# Altium footprint library Special.PcbLib: 38 footprints (part 2 of 3)
Each footprint in its own frame and in the unit in brackets; x right, y up, seen from the top. Pads: shape width x height; smd on the part's side, far side on the other; paste and mask are expansions set on the pad; w line width, h text height; cw(c..) or ccw(c..) is an arc to the next point about the centre after c.
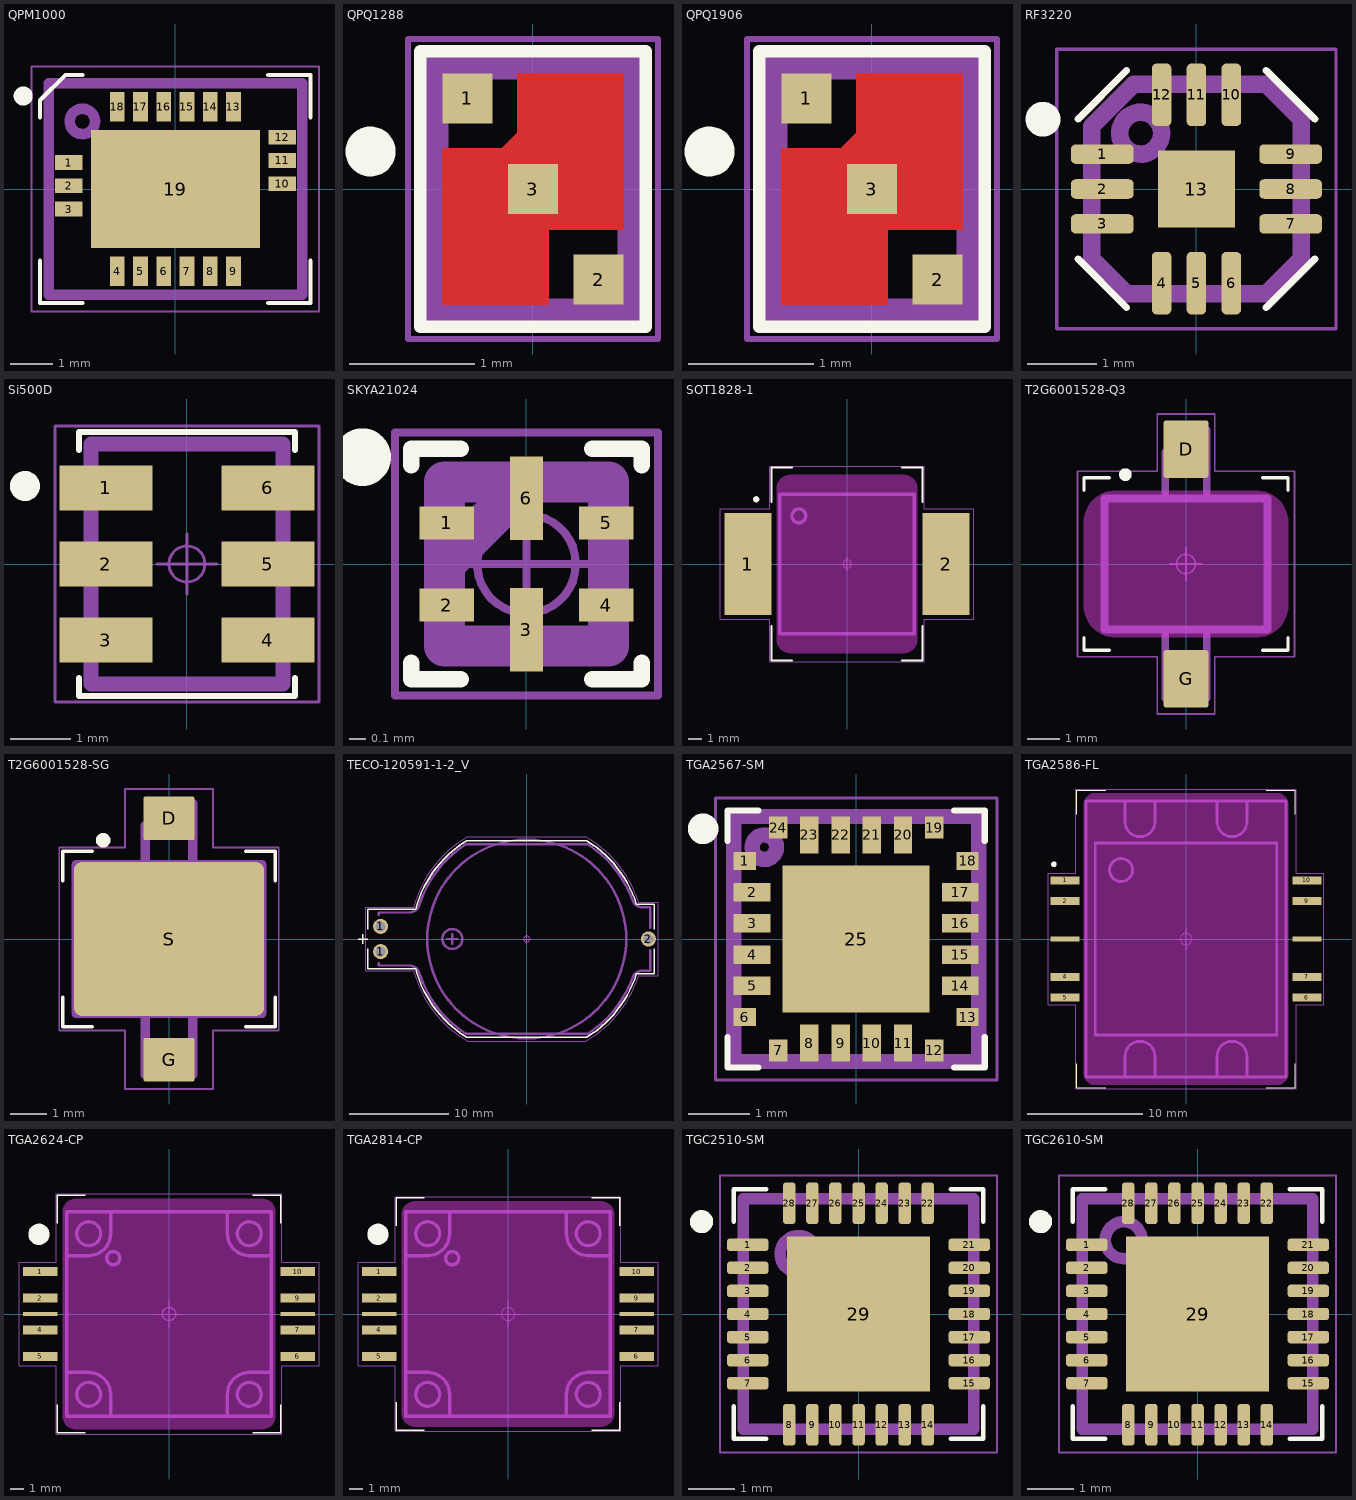
[diagram p1: the footprints below, top view; thin cyan lines are the x and y axes]

## QPM1000 [mm]
height 1.8
pads (19):
  rect 0.65x0.35 smd: 1(-2.525,0.625) 2(-2.525,0.075) 3(-2.525,-0.475) 10(2.525,0.125) 11(2.525,0.675) 12(2.525,1.225)
  rect 0.35x0.7 smd: 4(-1.375,-1.95) 5(-0.825,-1.95) 6(-0.275,-1.95) 7(0.275,-1.95) 8(0.825,-1.95) 9(1.375,-1.95) 13(1.375,1.95) 14(0.825,1.95) 15(0.275,1.95) 16(-0.275,1.95) 17(-0.825,1.95) 18(-1.375,1.95)
  rect 4x2.8 smd: 19(0,0)
Top Overlay:
  circle w0.25: c-3.6,2.2 r0.1
  lines w0.1: -3.2,-1.7 -3.2,-2.7 -2.2,-2.7 ; -3.2,1.7 -3.2,2.1 -2.6,2.7 -2.2,2.7 ; 2.2,-2.7 3.2,-2.7 3.2,-1.7 ; 2.2,2.7 3.2,2.7 3.2,1.7
Top Assembly:
  circle w0.25: c-2.2,1.6 r0.3
  lines w0.25: -3,-2.5 3,-2.5 3,2.5 -3,2.5 -3,-2.5
  text ".Designator" at -2.3,-0.4 h1.5
Top Courtyard:
  circle w0.05: c0,0 r0.3
  lines w0.05: -0.5,0 0.5,0 ; 0,-0.5 0,0.5 ; -3.4,-2.9 -3.4,2.9 3.4,2.9 3.4,-2.9 -3.4,-2.9
3D body "QPM1000.STEP": height 1.77, standoff 0, extent -3,-2.5 3,2.5

## QPQ1288 [mm] "Qorvo QPQ1288"
height 0.81
pads (3):
  rect 0.4x0.4 smd: 1(-0.525,0.725) 2(0.525,-0.725) 3(0,0)
Top Layer:
  region: 0.725,0.925 -0.125,0.925 -0.125,0.45 -0.25,0.325 -0.725,0.325 -0.725,-0.925 0.125,-0.925 0.125,-0.325 0.725,-0.325
Top Overlay:
  circle w0.2: c-1.3,0.3 r0.1
  lines w0.1: -0.9,-1.1 0.9,-1.1 0.9,1.1 -0.9,1.1 -0.9,-1.1
Top Assembly:
  lines w0.25: -0.8,-1 -0.8,1 0.8,1 0.8,-1 -0.8,-1
  text ".Designator" at -2,1.6 h1.5
Top Courtyard:
  circle w0.05: c0,0 r0.3
  lines w0.05: -0.5,0 0.5,0 ; 0,-0.5 0,0.5 ; -1,-1.2 1,-1.2 1,1.2 -1,1.2 -1,-1.2
3D body "QPQ1288.STEP": height 0.81, standoff 0, extent -0.8,-1 0.8,1

## QPQ1906 [mm] "Qorvo QPQ1906"
height 0.915
pads (3):
  rect 0.4x0.4 smd: 1(-0.525,0.725) 2(0.525,-0.725) 3(0,0)
Top Layer:
  region: 0.725,0.925 -0.125,0.925 -0.125,0.45 -0.25,0.325 -0.725,0.325 -0.725,-0.925 0.125,-0.925 0.125,-0.325 0.725,-0.325
Top Overlay:
  circle w0.2: c-1.3,0.3 r0.1
  lines w0.1: -0.9,-1.1 -0.9,1.1 0.9,1.1 0.9,-1.1 -0.9,-1.1
Top Assembly:
  lines w0.25: -0.8,-1 0.8,-1 0.8,1 -0.8,1 -0.8,-1
  text ".Designator" at -2,1.6 h1.5
Top Courtyard:
  circle w0.05: c0,0 r0.3
  lines w0.05: -0.5,0 0.5,0 ; 0,-0.5 0,0.5 ; -1,-1.2 -1,1.2 1,1.2 1,-1.2 -1,-1.2
3D body "QPQ1906.STEP": height 0.91, standoff 0, extent -0.8,-1 0.8,1

## RF3220 [mm] "RFMD RF3220"
height 0.9
pads (13):
  rrect50% 0.9x0.28 smd: 1(-1.35,0.5) 2(-1.35,0) 3(-1.35,-0.5) 7(1.35,-0.5) 8(1.35,0) 9(1.35,0.5)
  rrect50% 0.28x0.9 smd: 4(-0.5,-1.35) 5(0,-1.35) 6(0.5,-1.35) 10(0.5,1.35) 11(0,1.35) 12(-0.5,1.35)
  rect 1.1x1.1 smd: 13(0,0)
Top Overlay:
  circle w0.3: c-2.2,1 r0.1
  lines w0.1: -1.7,-1 -1,-1.7 ; -1.7,1 -1,1.7 ; 1,-1.7 1.7,-1 ; 1,1.7 1.7,1
Top Assembly:
  circle w0.25: c-0.8,0.8 r0.3
  lines w0.25: -1.5,-1 -1,-1.5 1,-1.5 1.5,-1 1.5,1 1,1.5 -0.9,1.5 -1.5,0.9 -1.5,-1
  text ".Designator" at -1.3,-0.6 h1.5
Top Courtyard:
  circle w0.05: c0,0 r0.3
  lines w0.05: -0.5,0 0.5,0 ; 0,-0.5 0,0.5 ; -2,-2 -2,2 2,2 2,-2 -2,-2
3D body "RF3220.STEP": height 0.9, standoff 0, extent -1.55,-1.55 1.55,1.55

## Si500D [mm] "Si500D 3.2 x 5.0 mm XOs"
height 0.9
pads (6):
  rect 1.55x0.75 smd: 1(-1.35,1.27) 2(-1.35,0) 3(-1.35,-1.27) 4(1.35,-1.27) 5(1.35,0) 6(1.35,1.27)
Top Overlay:
  circle w0.3: c-2.7,1.3 r0.1
  lines w0.1: -1.8,-1.9 -1.8,-2.2 1.8,-2.2 1.8,-1.9 ; -1.8,1.9 -1.8,2.2 1.8,2.2 1.8,1.9
Top Assembly:
  circle w0.25: c-1,1.3 r0.2
  lines w0.25: -1.6,-2 -1.6,2 1.6,2 1.6,-2 -1.6,-2
  text ".Designator" at 1.1,-1.7 h1.5
Top Courtyard:
  circle w0.05: c0,0 r0.3
  lines w0.05: -0.5,0 0.5,0 ; 0,-0.5 0,0.5 ; -2.2,-2.3 2.2,-2.3 2.2,2.3 -2.2,2.3 -2.2,-2.3
3D body "Si500D.STEP": height 0.9, standoff 0, extent -1.6,-2 1.6,2

## SKYA21024 [mm] "Slyworks SKYA21024"
height 0.5
pads (6):
  rect 0.33x0.2 smd: 1(-0.485,0.25) 2(-0.485,-0.25) 4(0.485,-0.25) 5(0.485,0.25)
  rect 0.2x0.51 smd: 3(0,-0.4) 6(0,0.4)
Top Overlay:
  circle w0.3: c-1,0.65 r0.025
  lines w0.1: -0.7,-0.6 -0.7,-0.7 -0.4,-0.7 ; -0.7,0.6 -0.7,0.7 -0.4,0.7 ; 0.4,-0.7 0.7,-0.7 0.7,-0.6 ; 0.4,0.7 0.7,0.7 0.7,0.6
Top Assembly:
  lines w0.25: -0.5,0 0,0.5 ; -0.5,-0.5 0.5,-0.5 0.5,0.5 -0.5,0.5 -0.5,-0.5
  text ".Designator" at -1.7,1 h1.5
Top Courtyard:
  circle w0.05: c0,0 r0.3
  lines w0.05: -0.5,0 0.5,0 ; 0,-0.5 0,0.5 ; -0.8,-0.8 -0.8,0.8 0.8,0.8 0.8,-0.8 -0.8,-0.8
3D body "SKYA21024.STEP": height 0.5, standoff 0, extent -0.55,-0.55 0.55,0.55

## SOT1828-1 [mm] "NXP CASE SOT1828-1"
height 2.5
pads (2):
  rect 3.4x7.4 smd: 1(-7.2,0) 2(7.2,0)
Top Overlay:
  circle w0.25: c-6.6,4.7 r0.1
  lines w0.15: -5.5,-4.5 -5.5,-7 -4,-7 ; -5.5,4.5 -5.5,7 -4,7 ; 4,-7 5.5,-7 5.5,-4.5 ; 4,7 5.5,7 5.5,4.5
Keep-Out Layer:
  board cut-out: -5.1,-5.5 -5.1,5.5 -5.1,5.598 -5.062,5.792 -4.986,5.974 -4.877,6.137 -4.737,6.277 -4.574,6.386 -4.392,6.462 -4.198,6.5 -4.1,6.5 4.1,6.5 4.198,6.5 4.392,6.462 4.574,6.386 4.737,6.277 4.877,6.137 4.986,5.974 5.062,5.792 5.1,5.598 5.1,5.5 5.1,-5.5 5.1,-5.598 5.062,-5.792 4.986,-5.974 4.877,-6.137 4.737,-6.277 4.574,-6.386 4.392,-6.462 4.198,-6.5 4.1,-6.5 -4.1,-6.5 -4.198,-6.5 -4.392,-6.462 -4.574,-6.386 -4.737,-6.277 -4.877,-6.137 -4.986,-5.974 -5.062,-5.792 -5.1,-5.598
Top Assembly:
  circle w0.25: c-3.5,3.5 r0.5
  lines w0.25: -4.9,-5.075 4.9,-5.075 4.9,5.075 -4.9,5.075 -4.9,-5.075
  text ".Designator" at -3.4,-0.3 h1.5
Top Courtyard:
  circle w0.05: c0,0 r0.3
  lines w0.05: -0.5,0 0.5,0 ; 0,-0.5 0,0.5 ; -9.2,-4 -9.2,4 -5.6,4 -5.6,7.1 5.6,7.1 5.6,4 9.2,4 9.2,-4 5.6,-4 5.6,-7.1 -5.6,-7.1 -5.6,-4 -9.2,-4
3D body "CASE SOT1828-1.STEP": height 2.57, standoff -1.58, extent -7.8,-5.08 7.8,5.08

## T2G6001528-Q3 [mm] "Qorvo T2G6001528-Q3"
height 1.7
pads (2):
  rrect10% 1.4x1.8 smd: D(0,3.6) G(0,-3.6)
Top Overlay:
  circle w0.2: c-1.9,2.8 r0.1
  lines w0.1: -3.2,-2.3 -3.2,-2.7 -2.4,-2.7 ; -3.2,2.3 -3.2,2.7 -2.4,2.7 ; 2.4,-2.7 3.2,-2.7 3.2,-2.3 ; 2.4,2.7 3.2,2.7 3.2,2.3
Keep-Out Layer:
  board cut-out: -3.2,-1.3 -3.2,1.3 -3.2,1.399 -3.162,1.592 -3.086,1.774 -2.977,1.937 -2.837,2.077 -2.674,2.186 -2.492,2.262 -2.298,2.3 -2.2,2.3 2.2,2.3 2.298,2.3 2.492,2.261 2.674,2.186 2.837,2.077 2.977,1.937 3.086,1.774 3.162,1.592 3.2,1.398 3.2,1.3 3.2,-1.3 3.2,-1.399 3.162,-1.592 3.086,-1.774 2.977,-1.938 2.837,-2.077 2.674,-2.186 2.492,-2.262 2.298,-2.3 2.2,-2.3 -2.2,-2.3 -2.298,-2.3 -2.492,-2.262 -2.674,-2.186 -2.837,-2.077 -2.977,-1.937 -3.086,-1.774 -3.162,-1.592 -3.2,-1.399
Top Assembly:
  lines w0.25: -0.65,-2.05 -0.65,-4.2 0.65,-4.2 0.65,-2.05 ; -0.65,2.05 -0.65,3.5 0.05,4.2 0.65,4.2 0.65,2.05 ; -2.55,-2.05 2.55,-2.05 2.55,2.05 -2.55,2.05 -2.55,-2.05
  text ".Designator" at -2.2,-0.3 h1.5
Top Courtyard:
  circle w0.05: c0,0 r0.3
  lines w0.05: -0.5,0 0.5,0 ; 0,-0.5 0,0.5 ; -3.4,-2.9 -0.9,-2.9 -0.9,-4.7 0.9,-4.7 0.9,-2.9 3.4,-2.9 3.4,2.9 0.9,2.9 0.9,4.7 -0.9,4.7 -0.9,2.9 -3.4,2.9 -3.4,-2.9
3D body "T2G6001528-Q3.STEP": height 2.08, standoff -0.71, extent -2.54,-4.203 2.54,4.204

## T2G6001528-SG [mm] "Qorvo T2G6001528-SG"
height 2.8
pads (3):
  rrect10% 1.4x1.2 smd: D(0,3.3) G(0,-3.3)
  rrect10% 5.2x4.2 smd: S(0,0)
Top Overlay:
  circle w0.2: c-1.8,2.7 r0.1
  lines w0.1: -2.9,-1.6 -2.9,-2.4 -2.1,-2.4 ; -2.9,1.6 -2.9,2.4 -2.1,2.4 ; 2.1,-2.4 2.9,-2.4 2.9,-1.6 ; 2.1,2.4 2.9,2.4 2.9,1.6
Top Assembly:
  lines w0.25: -0.65,-2.05 -0.65,-3.7 0.65,-3.7 0.65,-2.05 ; -0.65,2.05 -0.65,3.1 -0.05,3.7 0.65,3.7 0.65,2.05 ; -2.54,-2.03 -2.54,2.03 2.54,2.03 2.54,-2.03 -2.54,-2.03
  text ".Designator" at -2.2,-0.4 h1.5
Top Courtyard:
  circle w0.05: c0,0 r0.3
  lines w0.05: -0.5,0 0.5,0 ; 0,-0.5 0,0.5 ; -3,-2.5 -3,2.5 -1.2,2.5 -1.2,4.1 1.2,4.1 1.2,2.5 3,2.5 3,-2.5 1.2,-2.5 1.2,-4.1 -1.2,-4.1 -1.2,-2.5 -3,-2.5
3D body "T2G6001528-SG.STEP": height 2.79, standoff 0, extent -2.54,-3.683 2.54,3.683

## TECO-120591-1-2_V [mm] "Lithium Battery Holder"
height 6.5
pads (3):
  round 1.52 hole 1.02: 1(-14.69,-1.27) 1(-14.69,1.27) 2(12.23,0)
Top Overlay:
  lines w0.15: -16.97,0 -15.97,0 ; -16.47,-0.5 -16.47,0.5 ; -16,-1 -16,-2.997 -11.183,-2.997 ccw(c0,0) -6.045,-9.874 6.045,-9.874 ccw(c0,0) 11.036,-3.5 12.8,-3.5 12.8,-1 ; -16,1 -16,2.997 -11.183,2.997 cw(c0,0) -6.045,9.874 6.045,9.874 cw(c0,0) 11.036,3.5 12.8,3.5 12.8,1
Top Assembly:
  circle w0.25: c0,0 r10
  circle w0.25: c-7.48,0 r1
  lines w0.25: -14.88,-2.414 -14.88,-2.665 -11.787,-2.665 cw(c-11.787,-3.685) -10.802,-3.421 ccw(c0,0) -6.135,-9.525 6.135,-9.525 ccw(c0,0) 10.644,-3.883 cw(c11.615,-4.195) 11.615,-3.175 12.42,-3.175 12.42,-1.144 ; -14.88,2.414 -14.88,2.665 -11.787,2.665 ccw(c-11.787,3.685) -10.802,3.421 ; -10.801,3.421 cw(c0.001,0) -6.135,9.525 ; -7.98,0 -6.98,0 ; -7.48,-0.5 -7.48,0.5 ; -6.135,9.525 6.135,9.525 cw(c0,0) 10.644,3.883 ccw(c11.615,4.195) 11.615,3.175 12.42,3.175 12.42,1.144
Top Courtyard:
  circle w0.05: c0,0 r0.3
  lines w0.05: -0.5,0 0.5,0 ; 0,-0.5 0,0.5 ; 11.239,-3.703 cw(c0.203,-0.203) 5.914,-10.274 -5.915,-10.274 cw(c-0.203,-0.203) -11.387,-3.2 -16.2,-3.2 -16.2,3.2 -11.387,3.2 cw(c-0.203,0.203) -5.915,10.274 5.914,10.274 cw(c0.203,0.203) 11.239,3.703 ; 11.239,-3.7 13.2,-3.7 13.2,3.7 11.239,3.7
3D body "c-120591-1-j1-3d.stp": height 6.41, standoff -3.04, extent -14.88,-9.525 12.425,9.525

## TGA2567-SM [mm] "Qorvo TGA-2567-SM"
height 1.7
pads (25):
  rect 0.36x0.3 smd: 1(-1.82,1.275) 6(-1.82,-1.275) 13(1.82,-1.275) 18(1.82,1.275)
  rect 0.6x0.3 smd: 2(-1.7,0.765) 3(-1.7,0.255) 4(-1.7,-0.255) 5(-1.7,-0.765) 14(1.7,-0.765) 15(1.7,-0.255) 16(1.7,0.255) 17(1.7,0.765)
  rect 0.3x0.36 smd: 7(-1.275,-1.82) 12(1.275,-1.82) 19(1.275,1.82) 24(-1.275,1.82)
  rect 0.3x0.6 smd: 8(-0.765,-1.7) 9(-0.255,-1.7) 10(0.255,-1.7) 11(0.765,-1.7) 20(0.765,1.7) 21(0.255,1.7) 22(-0.255,1.7) 23(-0.765,1.7)
  rect 2.4x2.4 smd: 25(0,0)
Top Overlay:
  circle w0.3: c-2.5,1.8 r0.1
  lines w0.1: -2.1,-1.6 -2.1,-2.1 -1.6,-2.1 ; -2.1,1.6 -2.1,2.1 -1.6,2.1 ; 1.6,-2.1 2.1,-2.1 2.1,-1.6 ; 1.6,2.1 2.1,2.1 2.1,1.6
Top Assembly:
  circle w0.25: c-1.5,1.5 r0.2
  lines w0.25: -2,-2 -2,2 2,2 2,-2 -2,-2
  text ".Designator" at -1.7,-0.4 h1.5
Top Courtyard:
  circle w0.05: c0,0 r0.3
  lines w0.05: -0.5,0 0.5,0 ; 0,-0.5 0,0.5 ; -2.3,-2.3 -2.3,2.3 2.3,2.3 2.3,-2.3 -2.3,-2.3
3D body "TGA2567-SM.STEP": height 1.72, standoff 0, extent -1.994,-1.994 1.994,1.994

## TGA2586-FL [mm] "10 pin CuW-base, flanged  package"
height 1.9
pads (10):
  rect 2.5x0.7 smd: 1(-10.525,5.1) 2(-10.525,3.3) 4(-10.525,-3.3) 5(-10.525,-5.1) 6(10.525,-5.1) 7(10.525,-3.3) 9(10.525,3.3) 10(10.525,5.1)
  rect 2.5x0.4 smd: 3(-10.525,0) 8(10.525,0)
Top Overlay:
  circle w0.3: c-11.5,6.5 r0.1
  lines w0.1: -9.5,-10.85 -9.5,-12.95 -7,-12.95 ; -9.5,10.85 -9.5,12.95 -7,12.95 ; 7,-12.95 9.5,-12.95 9.5,-10.85 ; 7,12.95 9.5,12.95 9.5,10.85
Keep-Out Layer:
  board cut-out: -8.875,11.725 -8.875,-11.725 -8.875,-11.821 -8.838,-12.009 -8.764,-12.187 -8.657,-12.347 -8.522,-12.482 -8.362,-12.589 -8.184,-12.663 -7.996,-12.7 -7.9,-12.7 7.9,-12.7 7.996,-12.7 8.184,-12.663 8.362,-12.589 8.522,-12.482 8.657,-12.347 8.764,-12.187 8.838,-12.009 8.875,-11.821 8.875,-11.725 8.875,11.725 8.875,11.821 8.838,12.009 8.764,12.187 8.657,12.347 8.522,12.482 8.362,12.589 8.184,12.662 7.996,12.7 7.9,12.7 -7.9,12.7 -7.996,12.7 -8.184,12.663 -8.362,12.589 -8.522,12.482 -8.657,12.347 -8.764,12.187 -8.838,12.009 -8.875,11.821
Top Assembly:
  circle w0.25: c-5.65,6 r1
  lines w0.25: -5.3,-12 -5.3,-10.2 cw(c-4,-10.2) -2.7,-10.2 -2.7,-12 ; -5.3,12 -5.3,10.2 ccw(c-4,10.2) -2.7,10.2 -2.7,12 ; 2.7,-12 2.7,-10.2 cw(c4,-10.2) 5.3,-10.2 5.3,-12 ; 2.7,12 2.7,10.2 ccw(c4,10.2) 5.3,10.2 5.3,12 ; -8.7,-12 8.7,-12 8.7,12 -8.7,12 -8.7,-12 ; -7.9,-8.35 7.9,-8.35 7.9,8.35 -7.9,8.35 -7.9,-8.35
  text ".Designator" at -2.7,-0.2 h1.5
Top Courtyard:
  circle w0.1: c0,0 r0.5
  lines w0.05: -1,0 1,0 ; 0,-1 0,1 ; -12,-5.7 -12,5.7 -9.6,5.7 -9.6,13.05 9.6,13.05 9.6,5.7 12,5.7 12,-5.7 9.6,-5.7 9.6,-13.05 -9.6,-13.05 -9.6,-5.7 -12,-5.7
3D body "TGA2586-FL.STEP": height 1.91, standoff -2.03, extent -10.706,-12.001 10.706,12.002

## TGA2624-CP [mm] "10-lead 15x15 mm  bolt-down package with a Cu base"
height 2.1
pads (10):
  rect 2.6x0.7 smd: 1(-9.7,3.2) 2(-9.7,1.2) 4(-9.7,-1.2) 5(-9.7,-3.2) 6(9.7,-3.2) 7(9.7,-1.2) 9(9.7,1.2) 10(9.7,3.2)
  rect 2.6x0.3 smd: 3(-9.7,0) 8(9.7,0)
Top Overlay:
  circle w0.8: c-9.8,6 r0.4
  lines w0.1: -8.4,-6.85 -8.4,-8.95 -6.3,-8.95 ; -8.4,6.85 -8.4,8.95 -6.3,8.95 ; 6.3,-8.95 8.4,-8.95 8.4,-6.85 ; 6.3,8.95 8.4,8.95 8.4,6.85
Keep-Out Layer:
  board cut-out: -7,8.7 7,8.7 7.098,8.7 7.292,8.662 7.474,8.586 7.637,8.477 7.777,8.337 7.886,8.174 7.962,7.992 8,7.798 8,7.7 8,-7.7 8,-7.799 7.962,-7.992 7.886,-8.174 7.777,-8.337 7.637,-8.477 7.474,-8.586 7.292,-8.662 7.098,-8.7 7,-8.7 -7,-8.7 -7.098,-8.7 -7.292,-8.662 -7.474,-8.586 -7.637,-8.477 -7.777,-8.337 -7.886,-8.174 -7.962,-7.992 -8,-7.798 -8,-7.7 -8,7.7 -8,7.798 -7.962,7.992 -7.886,8.174 -7.777,8.337 -7.638,8.477 -7.474,8.586 -7.292,8.662 -7.099,8.7
Top Assembly:
  circle w0.25: c-4.2,4.2 r0.5
  circle w0.25: c-6.05,-6.05 r0.9
  circle w0.25: c6.05,-6.05 r0.9
  circle w0.25: c6.05,6.05 r0.9
  circle w0.25: c-6.05,6.05 r0.9
  lines w0.25: -7.7,-4.4 -6,-4.4 ; -7.7,4.4 -6,4.4 ; -6.05,-4.4 cw(c-6.05,-6.05) -4.4,-6.05 ; -6.05,4.4 ccw(c-6.05,6.05) -4.4,6.05 ; -4.4,-7.7 -4.4,-6 ; -4.4,6 -4.4,7.7 ; 4.4,-7.7 4.4,-6 ; 4.4,-6.05 cw(c6.05,-6.05) 6.05,-4.4 ; 4.4,6 4.4,7.7 ; 4.4,6.05 ccw(c6.05,6.05) 6.05,4.4 ; 6,-4.4 7.7,-4.4 ; 6,4.4 7.7,4.4 ; -7.7,-7.7 -7.7,7.7 7.7,7.7 7.7,-7.7 -7.7,-7.7
  text ".Designator" at -2.7,-0.2 h1.5
Top Courtyard:
  circle w0.1: c0,0 r0.5
  lines w0.05: -1,0 1,0 ; 0,-1 0,1 ; -11.3,-3.9 -8.5,-3.9 -8.5,-9.05 8.5,-9.05 8.5,-3.9 11.3,-3.9 11.3,3.9 8.5,3.9 8.5,9.05 -8.5,9.05 -8.5,3.9 -11.3,3.9 -11.3,-3.9
3D body "tga-2624-cp.STEP": height 2.2, standoff -1.4, extent -9.55,-7.65 9.55,7.65

## TGA2814-CP [mm] "10-lead 15x15 mm  bolt-down package with a Cu base"
height 2.1
pads (10):
  rect 2.6x0.7 smd: 1(-9.7,3.2) 2(-9.7,1.2) 4(-9.7,-1.2) 5(-9.7,-3.2) 6(9.7,-3.2) 7(9.7,-1.2) 9(9.7,1.2) 10(9.7,3.2)
  rect 2.6x0.3 smd: 3(-9.7,0) 8(9.7,0)
Top Overlay:
  circle w0.8: c-9.8,6 r0.4
  lines w0.1: -8.4,-6.65 -8.4,-8.75 -6.3,-8.75 ; -8.4,6.65 -8.4,8.75 -6.3,8.75 ; 6.3,-8.75 8.4,-8.75 8.4,-6.65 ; 6.3,8.75 8.4,8.75 8.4,6.65
Keep-Out Layer:
  board cut-out: -7,8.5 7,8.5 7.098,8.5 7.292,8.462 7.474,8.386 7.637,8.277 7.777,8.137 7.886,7.974 7.962,7.792 8,7.598 8,7.5 8,-7.5 8,-7.599 7.961,-7.792 7.886,-7.974 7.777,-8.137 7.637,-8.277 7.474,-8.386 7.292,-8.462 7.098,-8.5 7,-8.5 -7,-8.5 -7.098,-8.5 -7.292,-8.462 -7.474,-8.386 -7.637,-8.277 -7.777,-8.137 -7.886,-7.974 -7.962,-7.792 -8,-7.598 -8,-7.5 -8,7.5 -8,7.599 -7.962,7.792 -7.886,7.974 -7.777,8.137 -7.637,8.277 -7.474,8.386 -7.292,8.462 -7.099,8.5
Top Assembly:
  circle w0.25: c-6.05,6.05 r0.9
  circle w0.25: c6.05,6.05 r0.9
  circle w0.25: c6.05,-6.05 r0.9
  circle w0.25: c-6.05,-6.05 r0.9
  circle w0.25: c-4.2,4.2 r0.5
  lines w0.25: -7.7,-4.4 -6,-4.4 ; -7.7,4.4 -6,4.4 ; -6.05,-4.4 cw(c-6.05,-6.05) -4.4,-6.05 ; -6.05,4.4 ccw(c-6.05,6.05) -4.4,6.05 ; -4.4,-7.7 -4.4,-6 ; -4.4,6 -4.4,7.7 ; 4.4,-7.7 4.4,-6 ; 4.4,-6.05 cw(c6.05,-6.05) 6.05,-4.4 ; 4.4,6 4.4,7.7 ; 4.4,6.05 ccw(c6.05,6.05) 6.05,4.4 ; 6,-4.4 7.7,-4.4 ; 6,4.4 7.7,4.4 ; -7.7,-7.7 7.7,-7.7 7.7,7.7 -7.7,7.7 -7.7,-7.7
  text ".Designator" at -2.6,-0.1 h1.5
Top Courtyard:
  circle w0.05: c0,0 r0.5
  lines w0.05: -1,0 1,0 ; 0,-1 0,1 ; -11.3,-3.9 -11.3,3.9 -8.5,3.9 -8.5,8.85 8.5,8.85 8.5,3.9 11.3,3.9 11.3,-3.9 8.5,-3.9 8.5,-8.85 -8.5,-8.85 -8.5,-3.9 -11.3,-3.9
3D body "TGA2814-CP.STEP": height 2.76, standoff -1, extent -9.525,-7.62 9.525,7.62

## TGC2510-SM [mm] "TGC2510-SM"
height 1.4
pads (29):
  rrect50% 0.9x0.27 smd: 1(-2.4,1.5) 2(-2.4,1) 3(-2.4,0.5) 4(-2.4,0) 5(-2.4,-0.5) 6(-2.4,-1) 7(-2.4,-1.5) 15(2.4,-1.5) 16(2.4,-1) 17(2.4,-0.5) 18(2.4,0) 19(2.4,0.5) 20(2.4,1) 21(2.4,1.5)
  rrect50% 0.27x0.9 smd: 8(-1.5,-2.4) 9(-1,-2.4) 10(-0.5,-2.4) 11(0,-2.4) 12(0.5,-2.4) 13(1,-2.4) 14(1.5,-2.4) 22(1.5,2.4) 23(1,2.4) 24(0.5,2.4) 25(0,2.4) 26(-0.5,2.4) 27(-1,2.4) 28(-1.5,2.4)
  rect 3.1x3.35 smd paste-3.35 mask-3.35: 29(0,0)
Top Overlay:
  circle w0.3: c-3.4,2 r0.1
  lines w0.1: -2.7,-2 -2.7,-2.7 -2,-2.7 ; -2.7,2 -2.7,2.7 -2,2.7 ; 2,-2.7 2.7,-2.7 2.7,-2 ; 2,2.7 2.7,2.7 2.7,2
Top Paste:
  region: 0.235,1.435 1.315,1.435 1.315,0.235 0.235,0.235
  region: 0.235,-1.435 1.315,-1.435 1.315,-0.235 0.235,-0.235
  region: -0.235,-1.435 -1.315,-1.435 -1.315,-0.235 -0.235,-0.235
  region: -0.235,1.435 -1.315,1.435 -1.315,0.235 -0.235,0.235
Top Solder:
  region: -1.55,-1.675 -1.55,1.675 1.55,1.675 1.55,-1.675
Top Assembly:
  circle w0.25: c-1.3,1.3 r0.4
  lines w0.25: -2.5,-2.5 -2.5,2.5 2.5,2.5 2.5,-2.5 -2.5,-2.5
  text ".Designator" at -2,-0.5 h1.5
Top Courtyard:
  circle w0.05: c0,0 r0.3
  lines w0.05: -0.5,0 0.5,0 ; 0,-0.5 0,0.5 ; -3,-3 3,-3 3,3 -3,3 -3,-3
3D body "TGC2510-SM.STEP": height 1.4, standoff 0, extent -2.55,-2.55 2.55,2.55

## TGC2610-SM [mm] "TGC2610-SM"
height 1.4
pads (29):
  rrect50% 0.9x0.27 smd: 1(-2.4,1.5) 2(-2.4,1) 3(-2.4,0.5) 4(-2.4,0) 5(-2.4,-0.5) 6(-2.4,-1) 7(-2.4,-1.5) 15(2.4,-1.5) 16(2.4,-1) 17(2.4,-0.5) 18(2.4,0) 19(2.4,0.5) 20(2.4,1) 21(2.4,1.5)
  rrect50% 0.27x0.9 smd: 8(-1.5,-2.4) 9(-1,-2.4) 10(-0.5,-2.4) 11(0,-2.4) 12(0.5,-2.4) 13(1,-2.4) 14(1.5,-2.4) 22(1.5,2.4) 23(1,2.4) 24(0.5,2.4) 25(0,2.4) 26(-0.5,2.4) 27(-1,2.4) 28(-1.5,2.4)
  rect 3.1x3.35 smd paste-3.35 mask-3.35: 29(0,0)
Top Overlay:
  circle w0.3: c-3.4,2 r0.1
  lines w0.1: -2.7,-2 -2.7,-2.7 -2,-2.7 ; -2.7,2 -2.7,2.7 -2,2.7 ; 2,-2.7 2.7,-2.7 2.7,-2 ; 2,2.7 2.7,2.7 2.7,2
Top Paste:
  region: 0.235,1.435 1.315,1.435 1.315,0.235 0.235,0.235
  region: 0.235,-1.435 1.315,-1.435 1.315,-0.235 0.235,-0.235
  region: -0.235,-1.435 -1.315,-1.435 -1.315,-0.235 -0.235,-0.235
  region: -0.235,1.435 -1.315,1.435 -1.315,0.235 -0.235,0.235
Top Solder:
  region: -1.55,-1.675 -1.55,1.675 1.55,1.675 1.55,-1.675
Top Assembly:
  circle w0.25: c-1.6,1.6 r0.4
  lines w0.25: -2.5,-2.5 -2.5,2.5 2.5,2.5 2.5,-2.5 -2.5,-2.5
  text ".Designator" at -2,-0.4 h1.5
Top Courtyard:
  circle w0.05: c0,0 r0.3
  lines w0.05: -0.5,0 0.5,0 ; 0,-0.5 0,0.5 ; -3,-3 3,-3 3,3 -3,3 -3,-3
3D body "TGC2610-SM.STEP": height 1.4, standoff 0, extent -2.55,-2.55 2.55,2.55